# Altium footprint library Relays.PcbLib: 115 footprints (part 4 of 8)
Each footprint in its own frame and in the unit in brackets; x right, y up, seen from the top. Pads: shape width x height; smd on the part's side, far side on the other; paste and mask are expansions set on the pad; w line width, h text height; cw(c..) or ccw(c..) is an arc to the next point about the centre after c.
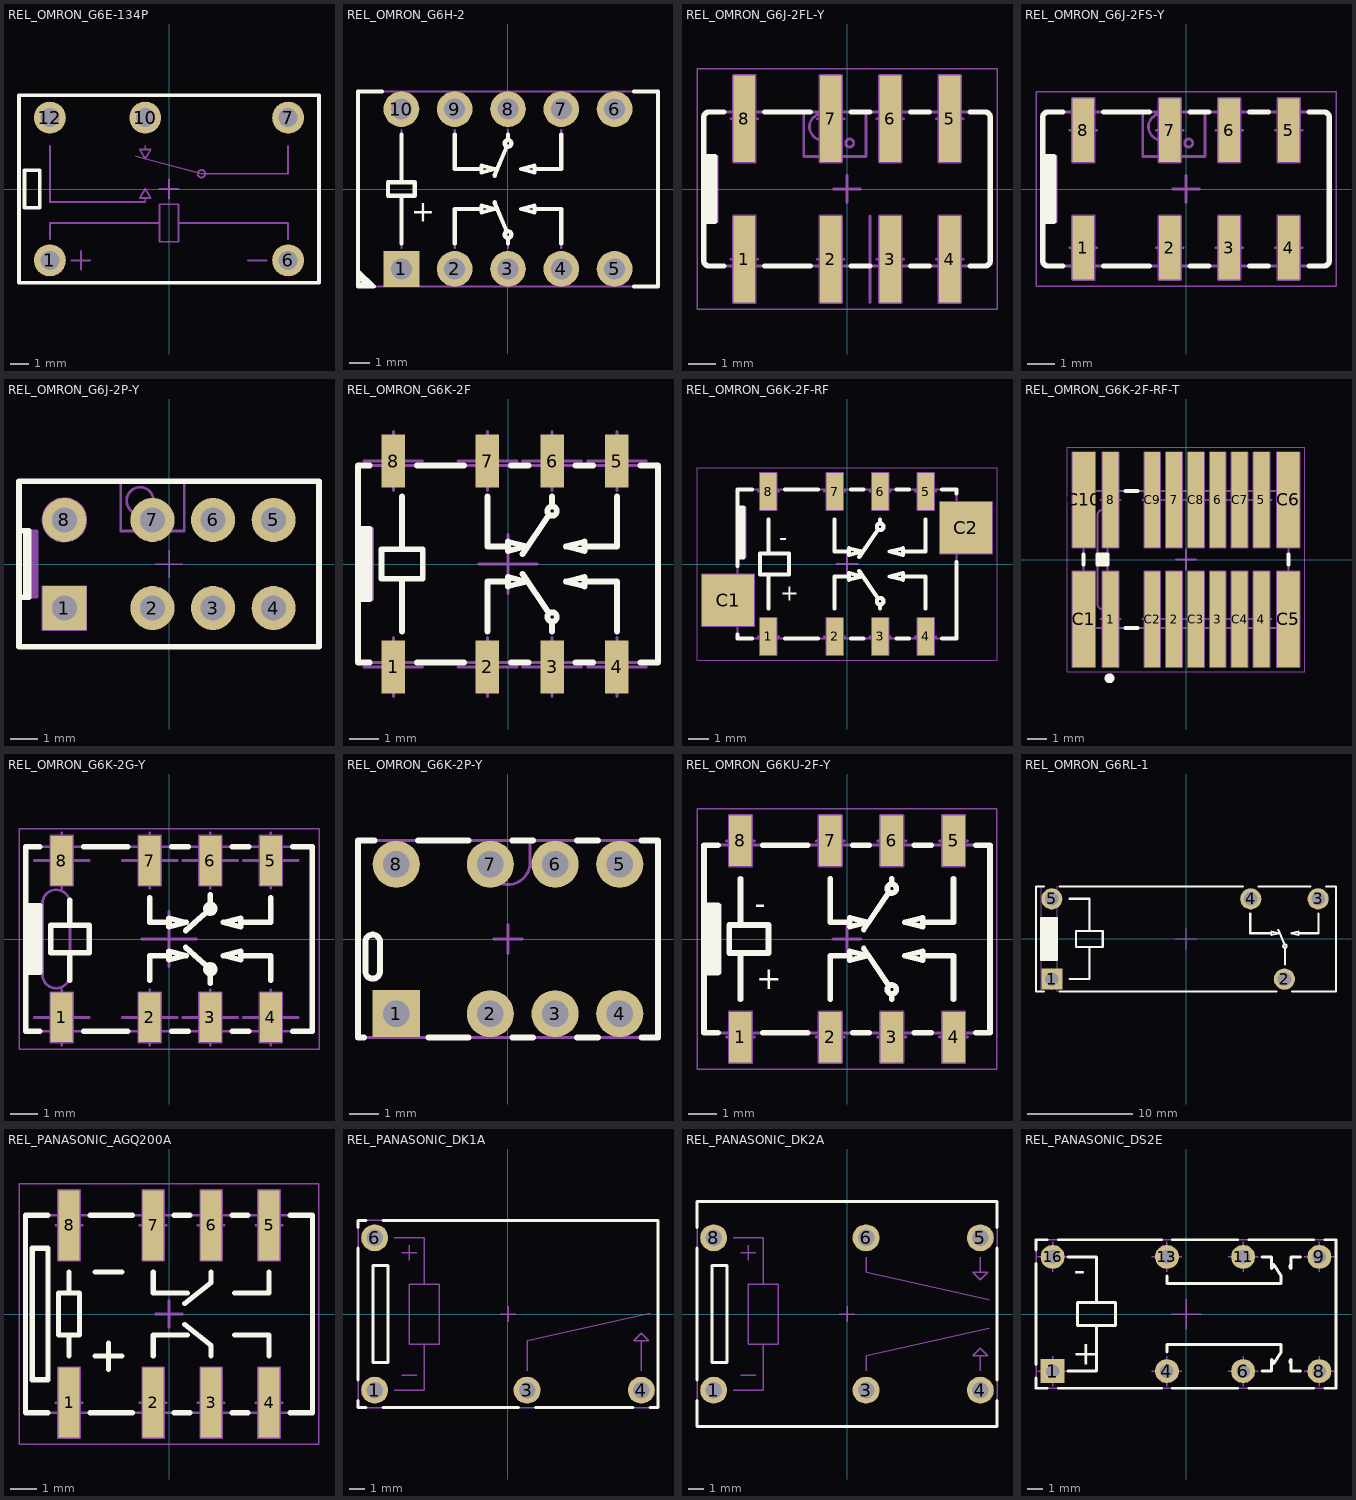
[diagram p3: the footprints below, top view; thin cyan lines are the x and y axes]

## REL_OMRON_G6E-134P [mm] "5 Leads, Row Spacing 7.62mm; Body 16mm x 10mm, OMRON G6E Series"
height 8
pads (5):
  round 1.7 hole 1: 1(-6.35,-3.81) 6(6.35,-3.81) 7(6.35,3.81) 10(-1.27,3.81) 12(-6.35,3.81)
Top Overlay:
  lines w0.2: -8,-5 8,-5 8,5 -8,5 -8,-5 ; -7.7,-1 -6.9,-1 -6.9,1 -7.7,1 -7.7,-1
Mechanical 8:
  lines w0.1: -6.85,-3.81 -6.35,-3.81 ; -6.85,3.81 -6.35,3.81 ; -6.35,-4.31 -6.35,-3.81 ; -6.35,-3.31 -6.35,-3.81 ; -6.35,3.31 -6.35,3.81 ; -6.35,4.31 -6.35,3.81 ; -5.85,-3.81 -6.35,-3.81 ; -5.85,3.81 -6.35,3.81 ; -1.77,3.81 -1.27,3.81 ; -1.27,3.31 -1.27,3.81 ; -1.27,4.31 -1.27,3.81 ; -0.77,3.81 -1.27,3.81 ; -0.5,0 0,0 ; 0,-0.5 0,0 ; 0,0.5 0,0 ; 0.5,0 0,0 ; 5.85,-3.81 6.35,-3.81 ; 5.85,3.81 6.35,3.81 ; 6.35,-4.31 6.35,-3.81 ; 6.35,-3.31 6.35,-3.81 ; 6.35,3.31 6.35,3.81 ; 6.35,4.31 6.35,3.81 ; 6.85,-3.81 6.35,-3.81 ; 6.85,3.81 6.35,3.81
Mechanical 14:
  circle w0.1: c1.73,0.81 r0.2
  lines w0.1: -6.35,-2.66 -6.35,-1.81 -0.5,-1.81 ; -6.35,2.31 -6.35,-0.69 -1.27,-0.69 -1.27,-0.49 ; -5.2,-3.81 -4.7,-3.81 ; -4.7,-4.31 -4.7,-3.81 ; -4.7,-3.31 -4.7,-3.81 ; -4.2,-3.81 -4.7,-3.81 ; -1.772,1.744 1.73,0.81 6.35,0.81 6.35,2.31 ; -1.27,2.11 -1.27,2.31 ; 0.5,-1.81 6.35,-1.81 6.35,-2.66 ; 4.2,-3.81 5.2,-3.81 ; -8,-5 -8,5 8,5 8,-5 -8,-5 ; -7.7,-1 -6.9,-1 -6.9,1 -7.7,1 -7.7,-1 ; -1.559,-0.49 -0.981,-0.49 -1.27,0.01 -1.559,-0.49 ; -1.559,2.11 -0.981,2.11 -1.27,1.61 -1.559,2.11 ; -0.5,-2.81 0.5,-2.81 0.5,-0.81 -0.5,-0.81 -0.5,-2.81
3D body "REL_OMRON_G6E-134P.stp": height 8, standoff -3.5, extent -8,-5 8,5

## REL_OMRON_G6H-2 [mm] "10 Leads, Row Spacing 7.62 mm; Body 14.3mm x 9.3mm, OMRON_G6H-2 Series"
height 5.4
pads (10):
  rect 1.7x1.7 hole 1: 1(-5.08,-3.81)
  round 1.7 hole 1: 2(-2.54,-3.81) 3(0,-3.81) 4(2.54,-3.81) 5(5.08,-3.81) 6(5.08,3.81) 7(2.54,3.81) 8(0,3.81) 9(-2.54,3.81) 10(-5.08,3.81)
Top Overlay:
  circle w0.2: c0,-2.175 r0.159
  circle w0.2: c0,2.175 r0.159
  lines w0.2: -7.15,-4.425 -6.925,-4.65 ; -7.15,-4.15 -6.65,-4.65 ; -7.15,-3.9 -6.4,-4.65 -7.15,-4.65 -7.15,4.65 -6,4.65 ; -5.08,-2.6 -5.08,-0.318 ; -5.08,0.318 -5.08,2.6 ; -2.54,-2.6 -2.54,-0.953 -1.27,-0.953 ; -2.54,2.6 -2.54,0.953 -1.27,0.953 ; -0.635,-0.635 -0.061,-2.028 ; -0.635,0.635 -0.061,2.028 ; 0,-2.6 0,-2.334 ; 0,2.334 0,2.6 ; 1.27,-0.953 2.54,-0.953 2.54,-2.6 ; 1.27,0.953 2.54,0.953 2.54,2.6 ; 6,-4.65 7.15,-4.65 7.15,4.65 6,4.65 ; -5.715,-0.318 -4.445,-0.318 -4.445,0.318 -5.715,0.318 -5.715,-0.318 ; -1.27,-1.111 -0.635,-0.953 -1.27,-0.794 -1.27,-1.111 ; -1.27,0.794 -0.635,0.953 -1.27,1.111 -1.27,0.794 ; 0.635,-0.953 1.27,-1.111 1.27,-0.794 0.635,-0.953 ; 0.635,0.953 1.27,1.111 1.27,0.794 0.635,0.953
  text "+" at -4.614,-1.558 h1
Mechanical 14:
  circle w0.1: c0,-2.175 r0.159
  circle w0.1: c0,2.175 r0.159
  lines w0.1: -7.15,-4.425 -6.925,-4.65 ; -7.15,-4.15 -6.65,-4.65 ; -7.15,-3.9 -6.4,-4.65 ; -5.08,-2.81 -5.08,-0.318 ; -5.08,0.318 -5.08,2.81 ; -2.54,-2.81 -2.54,-0.953 -1.27,-0.953 ; -2.54,2.81 -2.54,0.953 -1.27,0.953 ; -0.635,-0.635 -0.061,-2.028 ; -0.635,0.635 -0.061,2.028 ; 0,-2.81 0,-2.334 ; 0,2.334 0,2.81 ; 1.27,-0.953 2.54,-0.953 2.54,-2.81 ; 1.27,0.953 2.54,0.953 2.54,2.81 ; -7.15,-4.65 -7.15,4.65 7.15,4.65 7.15,-4.65 -7.15,-4.65 ; -5.715,-0.318 -4.445,-0.318 -4.445,0.318 -5.715,0.318 -5.715,-0.318 ; -1.27,-1.111 -0.635,-0.953 -1.27,-0.794 -1.27,-1.111 ; -1.27,0.794 -0.635,0.953 -1.27,1.111 -1.27,0.794 ; 0.635,-0.953 1.27,-1.111 1.27,-0.794 0.635,-0.953 ; 0.635,0.953 1.27,1.111 1.27,0.794 0.635,0.953
  text "+" at -4.614,-1.558 h1
3D body "REL_OMRON_G6H-2.stp": height 5.4, standoff -3.5, extent -7.15,-4.65 7.15,4.65

## REL_OMRON_G6J-2FL-Y [mm] "SMD Relay,  Body 10.6mm x 5.7mm, OMRON G6J-2FL-Y (Long Terminals)"
height 10
pads (8):
  rect 0.8x3.2 smd: 1(-3.8,-2.6) 2(-0.6,-2.6) 3(1.6,-2.6) 4(3.8,-2.6) 5(3.8,2.6) 6(1.6,2.6) 7(-0.6,2.6) 8(-3.8,2.6)
Top Overlay:
  lines w0.2: -5.3,-1.2 -4.9,-1.2 -4.9,1.2 -5.3,1.2 ; -5.2,-1.2 -5.2,1.2 ; -5.1,-1.2 -5.1,1.2 ; -5,-1.2 -5,1.2 ; -4.55,-2.85 -5.1,-2.85 cw(c-5.1,-2.65) -5.3,-2.65 -5.3,2.65 cw(c-5.1,2.65) -5.1,2.85 -4.55,2.85 ; -3.05,-2.85 -1.35,-2.85 ; -3.05,2.85 -1.35,2.85 ; 0.15,-2.85 0.85,-2.85 ; 0.15,2.85 0.85,2.85 ; 2.35,-2.85 3.05,-2.85 ; 2.35,2.85 3.05,2.85 ; 4.55,-2.85 5.1,-2.85 ccw(c5.1,-2.65) 5.3,-2.65 5.3,2.65 ccw(c5.1,2.65) 5.1,2.85 4.55,2.85
Mechanical 8:
  lines w0.1: -4.3,-2.6 -3.8,-2.6 ; -4.3,2.6 -3.8,2.6 ; -3.8,-3.1 -3.8,-2.6 ; -3.8,-2.1 -3.8,-2.6 ; -3.8,2.1 -3.8,2.6 ; -3.8,3.1 -3.8,2.6 ; -3.3,-2.6 -3.8,-2.6 ; -3.3,2.6 -3.8,2.6 ; -1.1,-2.6 -0.6,-2.6 ; -1.1,2.6 -0.6,2.6 ; -0.6,-3.1 -0.6,-2.6 ; -0.6,-2.1 -0.6,-2.6 ; -0.6,2.1 -0.6,2.6 ; -0.6,3.1 -0.6,2.6 ; -0.5,0 0,0 ; -0.1,-2.6 -0.6,-2.6 ; -0.1,2.6 -0.6,2.6 ; 0,-0.5 0,0 ; 0,0.5 0,0 ; 0.5,0 0,0 ; 0.85,-4.2 0.85,-1 ; 1.1,-2.6 1.6,-2.6 ; 1.1,2.6 1.6,2.6 ; 1.6,-3.1 1.6,-2.6 ; 1.6,-2.1 1.6,-2.6 ; 1.6,2.1 1.6,2.6 ; 1.6,3.1 1.6,2.6 ; 2.1,-2.6 1.6,-2.6 ; 2.1,2.6 1.6,2.6 ; 3.3,-2.6 3.8,-2.6 ; 3.3,2.6 3.8,2.6 ; 3.8,-3.1 3.8,-2.6 ; 3.8,-2.1 3.8,-2.6 ; 3.8,2.1 3.8,2.6 ; 3.8,3.1 3.8,2.6 ; 4.3,-2.6 3.8,-2.6 ; 4.3,2.6 3.8,2.6 ; -4.2,-4.2 -3.4,-4.2 -3.4,-1 -4.2,-1 -4.2,-4.2 ; -4.2,1 -3.4,1 -3.4,4.2 -4.2,4.2 -4.2,1 ; -1,-4.2 -0.2,-4.2 -0.2,-1 -1,-1 -1,-4.2 ; -1,1 -0.2,1 -0.2,4.2 -1,4.2 -1,1 ; 1.2,-4.2 2,-4.2 2,-1 1.2,-1 1.2,-4.2 ; 1.2,1 2,1 2,4.2 1.2,4.2 1.2,1 ; 3.4,-4.2 4.2,-4.2 4.2,-1 3.4,-1 3.4,-4.2 ; 3.4,1 4.2,1 4.2,4.2 3.4,4.2 3.4,1
Mechanical 14:
  circle w0.1: c-0.9,2.3 r0.49
  circle w0.1: c0.1,1.7 r0.15
  circle w0.1: c-0.9,2.3 r0.49
  lines w0.1: -5.3,-1.2 -4.8,-1.2 -4.8,1.2 -5.3,1.2 ; -5.2,-1.2 -5.2,1.2 ; -5.1,-1.2 -5.1,1.2 ; -5,-1.2 -5,1.2 ; -4.9,-1.2 -4.9,1.2 ; -4,-2.85 -4,-3.713 -3.6,-3.713 -3.6,-2.85 ; -4,2.85 -4,3.713 -3.6,3.713 -3.6,2.85 ; -1.6,2.72 -1.6,1.2 ; -1.6,2.85 -1.6,1.2 ; -0.8,-2.85 -0.8,-3.713 -0.4,-3.713 -0.4,-2.85 ; -0.8,2.85 -0.8,3.713 -0.4,3.713 -0.4,2.85 ; 0.7,2.72 0.7,1.2 ; 0.7,2.85 0.7,1.2 ; 1.4,-2.85 1.4,-3.713 1.8,-3.713 1.8,-2.85 ; 1.4,2.85 1.4,3.713 1.8,3.713 1.8,2.85 ; 3.6,-2.85 3.6,-3.713 4,-3.713 4,-2.85 ; 3.6,2.85 3.6,3.713 4,3.713 4,2.85 ; -1.6,1.2 0.7,1.2 ; -1.6,1.2 0.7,1.2 ; -5.3,-2.65 ccw(c-5.1,-2.65) -5.1,-2.85 5.1,-2.85 ccw(c5.1,-2.65) 5.3,-2.65 5.3,2.65 ccw(c5.1,2.65) 5.1,2.85 -5.1,2.85 ccw(c-5.1,2.65) -5.3,2.65 -5.3,-2.65
Mechanical 15:
  lines w0.05: -5.55,-4.45 -5.55,4.45 5.55,4.45 5.55,-4.45 -5.55,-4.45
3D body "REL_OMRON_G6J-2FL-Y.stp": height 10, standoff 0, extent -5.3,-3.713 5.3,3.713

## REL_OMRON_G6J-2FS-Y [mm] "SMD Relay,  Body 10.6mm x 5.7mm, OMRON G6J-2FS-Y (Short Terminals)"
height 10
pads (8):
  rect 0.8x2.35 smd: 1(-3.8,-2.175) 2(-0.6,-2.175) 3(1.6,-2.175) 4(3.8,-2.175) 5(3.8,2.175) 6(1.6,2.175) 7(-0.6,2.175) 8(-3.8,2.175)
Top Overlay:
  lines w0.2: -5.3,-1.2 -4.9,-1.2 -4.9,1.2 -5.3,1.2 ; -5.2,-1.2 -5.2,1.2 ; -5.1,-1.2 -5.1,1.2 ; -5,-1.2 -5,1.2 ; -4.55,-2.85 -5.1,-2.85 cw(c-5.1,-2.65) -5.3,-2.65 -5.3,2.65 cw(c-5.1,2.65) -5.1,2.85 -4.55,2.85 ; -3.05,-2.85 -1.35,-2.85 ; -3.05,2.85 -1.35,2.85 ; 0.15,-2.85 0.85,-2.85 ; 0.15,2.85 0.85,2.85 ; 2.35,-2.85 3.05,-2.85 ; 2.35,2.85 3.05,2.85 ; 4.55,-2.85 5.1,-2.85 ccw(c5.1,-2.65) 5.3,-2.65 5.3,2.65 ccw(c5.1,2.65) 5.1,2.85 4.55,2.85
Mechanical 8:
  lines w0.1: -4.3,-2.175 -3.8,-2.175 ; -4.3,2.175 -3.8,2.175 ; -3.8,-2.675 -3.8,-2.175 ; -3.8,-1.675 -3.8,-2.175 ; -3.8,1.675 -3.8,2.175 ; -3.8,2.675 -3.8,2.175 ; -3.3,-2.175 -3.8,-2.175 ; -3.3,2.175 -3.8,2.175 ; -1.1,-2.175 -0.6,-2.175 ; -1.1,2.175 -0.6,2.175 ; -0.6,-2.675 -0.6,-2.175 ; -0.6,-1.675 -0.6,-2.175 ; -0.6,1.675 -0.6,2.175 ; -0.6,2.675 -0.6,2.175 ; -0.5,0 0,0 ; -0.1,-2.175 -0.6,-2.175 ; -0.1,2.175 -0.6,2.175 ; 0,-0.5 0,0 ; 0,0.5 0,0 ; 0.5,0 0,0 ; 1.1,-2.175 1.6,-2.175 ; 1.1,2.175 1.6,2.175 ; 1.6,-2.675 1.6,-2.175 ; 1.6,-1.675 1.6,-2.175 ; 1.6,1.675 1.6,2.175 ; 1.6,2.675 1.6,2.175 ; 2.1,-2.175 1.6,-2.175 ; 2.1,2.175 1.6,2.175 ; 3.3,-2.175 3.8,-2.175 ; 3.3,2.175 3.8,2.175 ; 3.8,-2.675 3.8,-2.175 ; 3.8,-1.675 3.8,-2.175 ; 3.8,1.675 3.8,2.175 ; 3.8,2.675 3.8,2.175 ; 4.3,-2.175 3.8,-2.175 ; 4.3,2.175 3.8,2.175 ; -4.2,-3.35 -4.2,-1 -3.4,-1 -3.4,-3.35 -4.2,-3.35 ; -4.2,1 -4.2,3.35 -3.4,3.35 -3.4,1 -4.2,1 ; -1,-3.35 -1,-1 -0.2,-1 -0.2,-3.35 -1,-3.35 ; -1,1 -1,3.35 -0.2,3.35 -0.2,1 -1,1 ; 1.2,-3.35 1.2,-1 2,-1 2,-3.35 1.2,-3.35 ; 1.2,1 1.2,3.35 2,3.35 2,1 1.2,1 ; 3.4,-3.35 3.4,-1 4.2,-1 4.2,-3.35 3.4,-3.35 ; 3.4,1 3.4,3.35 4.2,3.35 4.2,1 3.4,1
Mechanical 14:
  circle w0.1: c-0.9,2.3 r0.49
  circle w0.1: c0.1,1.7 r0.15
  circle w0.1: c-0.9,2.3 r0.49
  lines w0.1: -5.3,-1.2 -4.8,-1.2 -4.8,1.2 -5.3,1.2 ; -5.2,-1.2 -5.2,1.2 ; -5.1,-1.2 -5.1,1.2 ; -5,-1.2 -5,1.2 ; -4.9,-1.2 -4.9,1.2 ; -1.6,2.72 -1.6,1.2 ; -1.6,2.85 -1.6,1.2 ; 0.7,2.72 0.7,1.2 ; 0.7,2.85 0.7,1.2 ; -1.6,1.2 0.7,1.2 ; -1.6,1.2 0.7,1.2 ; -5.3,-2.65 ccw(c-5.1,-2.65) -5.1,-2.85 5.1,-2.85 ccw(c5.1,-2.65) 5.3,-2.65 5.3,2.65 ccw(c5.1,2.65) 5.1,2.85 -5.1,2.85 ccw(c-5.1,2.65) -5.3,2.65 -5.3,-2.65
Mechanical 15:
  lines w0.05: -5.55,-3.6 -5.55,3.6 5.55,3.6 5.55,-3.6 -5.55,-3.6
3D body "REL_OMRON_G6J-2FS-Y.stp": height 10, standoff 0, extent -5.3,-2.863 5.3,2.863

## REL_OMRON_G6J-2P-Y [mm] "THT Relay, Body 10.9mm x 6mm, OMRON_G6J-2P"
height 9.3
pads (8):
  rect 1.6x1.6 hole 0.9: 1(-3.8,-1.6)
  round 1.6 hole 0.9: 2(-0.6,-1.6) 3(1.6,-1.6) 4(3.8,-1.6) 5(3.8,1.6) 6(1.6,1.6) 7(-0.6,1.6) 8(-3.8,1.6)
Top Overlay:
  lines w0.2: -5.3,-1.2 -5.1,-1.2 -5.1,1.2 -5.3,1.2 ; -5.2,-1.2 -5.2,1.2 ; -5.45,-3 5.45,-3 5.45,3 -5.45,3 -5.45,-3
Mechanical 8:
  circle w0.05: c-3.8,1.6 r0.45
  circle w0.05: c-3.8,1.6 r0.8
  circle w0.05: c-3.8,-1.6 r0.45
  lines w0.05: -4.3,-1.6 -3.8,-1.6 ; -4.3,1.6 -3.8,1.6 ; -3.8,-2.1 -3.8,-1.6 ; -3.8,-1.1 -3.8,-1.6 ; -3.8,1.1 -3.8,1.6 ; -3.8,2.1 -3.8,1.6 ; -3.3,-1.6 -3.8,-1.6 ; -3.3,1.6 -3.8,1.6 ; -1.1,-1.6 -0.6,-1.6 ; -1.1,1.6 -0.6,1.6 ; -0.6,-2.1 -0.6,-1.6 ; -0.6,-1.1 -0.6,-1.6 ; -0.6,1.1 -0.6,1.6 ; -0.6,2.1 -0.6,1.6 ; -0.5,0 0,0 ; -0.1,-1.6 -0.6,-1.6 ; -0.1,1.6 -0.6,1.6 ; 0,-0.5 0,0 ; 0,0.5 0,0 ; 0.5,0 0,0 ; 1.1,-1.6 1.6,-1.6 ; 1.1,1.6 1.6,1.6 ; 1.6,-2.1 1.6,-1.6 ; 1.6,-1.1 1.6,-1.6 ; 1.6,1.1 1.6,1.6 ; 1.6,2.1 1.6,1.6 ; 2.1,-1.6 1.6,-1.6 ; 2.1,1.6 1.6,1.6 ; 3.3,-1.6 3.8,-1.6 ; 3.3,1.6 3.8,1.6 ; 3.8,-2.1 3.8,-1.6 ; 3.8,-1.1 3.8,-1.6 ; 3.8,1.1 3.8,1.6 ; 3.8,2.1 3.8,1.6 ; 4.3,-1.6 3.8,-1.6 ; 4.3,1.6 3.8,1.6 ; -4.6,-2.4 -4.6,-0.8 -3,-0.8 -3,-2.4 -4.6,-2.4
Mechanical 14:
  circle w0.1: c-1.05,2.3 r0.49
  circle w0.1: c-0.05,1.7 r0.15
  lines w0.1: -5.3,-1.2 -4.8,-1.2 -4.8,1.2 -5.3,1.2 ; -5.2,-1.2 -5.2,1.2 ; -5.1,-1.2 -5.1,1.2 ; -5,-1.2 -5,1.2 ; -4.9,-1.2 -4.9,1.2 ; -1.75,3 -1.75,1.2 0.55,1.2 0.55,3 ; -5.45,-3 5.45,-3 5.45,3 -5.45,3 -5.45,-3
3D body "REL_OMRON_G6J-2P-Y.stp": height 9.3, standoff -3.5, extent -5.45,-3 5.45,3

## REL_OMRON_G6K-2F [mm] "SMD Relay,  Body 10.2mm x 6.7mm, OMRON_G6K-2F"
height 5.4
pads (8):
  rect 0.8x1.8 smd: 1(-3.9,-3.5) 2(-0.7,-3.5) 3(1.5,-3.5) 4(3.7,-3.5) 5(3.7,3.5) 6(1.5,3.5) 7(-0.7,3.5) 8(-3.9,3.5)
Top Overlay:
  circle w0.2: c1.5,1.8 r0.159
  circle w0.2: c1.5,-1.8 r0.159
  lines w0.2: -5.1,-1.2 -4.7,-1.2 -4.7,1.2 -5.1,1.2 ; -5,-1.2 -5,1.2 ; -4.9,-1.2 -4.9,1.2 ; -4.8,-1.2 -4.8,1.2 ; -4.7,-3.35 -5.1,-3.35 -5.1,3.35 -4.7,3.35 ; -3.6,-2.3 -3.6,-0.5 ; -3.6,0.5 -3.6,2.3 ; -3.1,-3.35 -1.5,-3.35 ; -3.1,3.35 -1.5,3.35 ; -0.7,-2.3 -0.7,-0.6 0,-0.6 ; -0.7,2.3 -0.7,0.6 0,0.6 ; 0.1,-3.35 0.7,-3.35 ; 0.1,3.35 0.7,3.35 ; 0.493,-0.338 1.4,-1.675 ; 0.493,0.338 1.4,1.675 ; 1.5,-2.3 1.5,-2 ; 1.5,2 1.5,2.3 ; 2.3,-3.35 2.9,-3.35 ; 2.3,3.35 2.9,3.35 ; 2.6,-0.6 3.7,-0.6 3.7,-2.3 ; 2.6,0.6 3.7,0.6 3.7,2.3 ; 4.5,-3.35 5.1,-3.35 5.1,3.35 4.5,3.35 ; -4.3,-0.5 -4.3,0.5 -2.9,0.5 -2.9,-0.5 -4.3,-0.5 ; 0,-0.759 0.635,-0.6 0,-0.441 0,-0.759 ; 0,0.441 0,0.759 0.635,0.6 0,0.441 ; 1.965,-0.6 2.6,-0.759 2.6,-0.441 1.965,-0.6 ; 1.965,0.6 2.6,0.441 2.6,0.759 1.965,0.6
Mechanical 8:
  lines w0.1: -4.9,-3.5 -3.9,-3.5 ; -4.9,3.5 -3.9,3.5 ; -3.9,-4.5 -3.9,-3.5 ; -3.9,-2.5 -3.9,-3.5 ; -3.9,2.5 -3.9,3.5 ; -3.9,4.5 -3.9,3.5 ; -2.9,-3.5 -3.9,-3.5 ; -2.9,3.5 -3.9,3.5 ; -1.7,-3.5 -0.7,-3.5 ; -1.7,3.5 -0.7,3.5 ; -1,0 0,0 ; -0.7,-4.5 -0.7,-3.5 ; -0.7,-2.5 -0.7,-3.5 ; -0.7,2.5 -0.7,3.5 ; -0.7,4.5 -0.7,3.5 ; 0,-1 0,0 ; 0,1 0,0 ; 0.3,-3.5 -0.7,-3.5 ; 0.3,3.5 -0.7,3.5 ; 0.5,-3.5 1.5,-3.5 ; 0.5,3.5 1.5,3.5 ; 1,0 0,0 ; 1.5,-4.5 1.5,-3.5 ; 1.5,-2.5 1.5,-3.5 ; 1.5,2.5 1.5,3.5 ; 1.5,4.5 1.5,3.5 ; 2.5,-3.5 1.5,-3.5 ; 2.5,3.5 1.5,3.5 ; 2.7,-3.5 3.7,-3.5 ; 2.7,3.5 3.7,3.5 ; 3.7,-4.5 3.7,-3.5 ; 3.7,-2.5 3.7,-3.5 ; 3.7,2.5 3.7,3.5 ; 3.7,4.5 3.7,3.5 ; 4.7,-3.5 3.7,-3.5 ; 4.7,3.5 3.7,3.5
Mechanical 14:
  circle w0.1: c1.5,1.8 r0.159
  circle w0.1: c1.5,-1.8 r0.159
  lines w0.1: -5.1,-1.2 -4.6,-1.2 -4.6,1.2 -5.1,1.2 ; -5,-1.2 -5,1.2 ; -4.9,-1.2 -4.9,1.2 ; -4.8,-1.2 -4.8,1.2 ; -4.7,-1.2 -4.7,1.2 ; -3.6,-2.3 -3.6,-0.5 ; -3.6,0.5 -3.6,2.3 ; -0.7,-2.3 -0.7,-0.6 0,-0.6 ; -0.7,2.3 -0.7,0.6 0,0.6 ; 0.493,-0.338 1.4,-1.675 ; 0.493,0.338 1.4,1.675 ; 1.5,-2.3 1.5,-2 ; 1.5,2 1.5,2.3 ; 2.6,-0.6 3.7,-0.6 3.7,-2.3 ; 2.6,0.6 3.7,0.6 3.7,2.3 ; -5.1,-3.35 -5.1,3.35 5.1,3.35 5.1,-3.35 -5.1,-3.35 ; -4.3,-0.5 -4.3,0.5 -2.9,0.5 -2.9,-0.5 -4.3,-0.5 ; 0,-0.759 0.635,-0.6 0,-0.441 0,-0.759 ; 0,0.441 0,0.759 0.635,0.6 0,0.441 ; 1.965,-0.6 2.6,-0.759 2.6,-0.441 1.965,-0.6 ; 1.965,0.6 2.6,0.441 2.6,0.759 1.965,0.6
3D body "REL_OMRON_G6K-2F.stp": height 5.4, standoff 0, extent -5.1,-3.9 5.1,3.9

## REL_OMRON_G6K-2F-RF [mm] "SMD Relay,  Body 10.3mm x 6.9mm, OMRON G6KU-2F-RF"
height 5.4
pads (10):
  rect 0.8x1.8 smd: 1(-3.8,-3.5) 2(-0.6,-3.5) 3(1.6,-3.5) 4(3.8,-3.5) 5(3.8,3.5) 6(1.6,3.5) 7(-0.6,3.5) 8(-3.8,3.5)
  rect 2.5x2.5 smd: C1(-5.75,-1.75) C2(5.75,1.75)
Top Overlay:
  circle w0.2: c1.6,1.8 r0.159
  circle w0.2: c1.6,-1.8 r0.159
  lines w0.2: -5.3,-3.4 -5.3,-3.6 -4.6,-3.6 ; -5.3,-0.1 -5.3,3.6 -4.6,3.6 ; -5.2,0.325 -5.2,2.725 ; -5.1,0.325 -5.1,2.725 ; -3.8,-2.15 -3.8,-0.6 ; -3.8,0.6 -3.8,2.15 ; -3,-3.6 -1.4,-3.6 ; -3,3.6 -1.4,3.6 ; -0.6,-2.15 -0.6,-0.6 0.1,-0.6 ; -0.6,2.15 -0.6,0.6 0.1,0.6 ; 0.2,-3.6 0.8,-3.6 ; 0.2,3.6 0.8,3.6 ; 0.593,-0.338 1.5,-1.675 ; 0.593,0.338 1.5,1.675 ; 1.6,-2.15 1.6,-2 ; 1.6,2 1.6,2.15 ; 2.4,-3.6 3,-3.6 ; 2.4,3.6 3,3.6 ; 2.7,-0.6 3.8,-0.6 3.8,-2.15 ; 2.7,0.6 3.8,0.6 3.8,2.15 ; 4.6,-3.6 5.3,-3.6 5.3,0.1 ; 4.6,3.6 5.3,3.6 5.3,3.4 ; -5.3,0.325 -5,0.325 -5,2.725 -5.3,2.725 -5.3,0.325 ; -4.2,-0.5 -4.2,0.5 -2.8,0.5 -2.8,-0.5 -4.2,-0.5 ; 0.1,-0.759 0.735,-0.6 0.1,-0.441 0.1,-0.759 ; 0.1,0.441 0.1,0.759 0.735,0.6 0.1,0.441 ; 2.065,-0.6 2.7,-0.759 2.7,-0.441 2.065,-0.6 ; 2.065,0.6 2.7,0.441 2.7,0.759 2.065,0.6
  text "-" at -3.284,0.89 h0.8
  text "+" at -3.234,-1.785 h0.8
Mechanical 8:
  lines w0.1: -6.25,-1.75 -5.75,-1.75 ; -5.75,-2.25 -5.75,-1.75 ; -5.75,-1.25 -5.75,-1.75 ; -5.25,-1.75 -5.75,-1.75 ; -4.3,-3.5 -3.8,-3.5 ; -4.3,3.5 -3.8,3.5 ; -3.8,-4 -3.8,-3.5 ; -3.8,-3 -3.8,-3.5 ; -3.8,3 -3.8,3.5 ; -3.8,4 -3.8,3.5 ; -3.3,-3.5 -3.8,-3.5 ; -3.3,3.5 -3.8,3.5 ; -1.1,-3.5 -0.6,-3.5 ; -1.1,3.5 -0.6,3.5 ; -0.6,-4 -0.6,-3.5 ; -0.6,-3 -0.6,-3.5 ; -0.6,3 -0.6,3.5 ; -0.6,4 -0.6,3.5 ; -0.1,-3.5 -0.6,-3.5 ; -0.1,3.5 -0.6,3.5 ; 1.1,-3.5 1.6,-3.5 ; 1.1,3.5 1.6,3.5 ; 1.6,-4 1.6,-3.5 ; 1.6,-3 1.6,-3.5 ; 1.6,3 1.6,3.5 ; 1.6,4 1.6,3.5 ; 2.1,-3.5 1.6,-3.5 ; 2.1,3.5 1.6,3.5 ; 3.3,-3.5 3.8,-3.5 ; 3.3,3.5 3.8,3.5 ; 3.8,-4 3.8,-3.5 ; 3.8,-3 3.8,-3.5 ; 3.8,3 3.8,3.5 ; 3.8,4 3.8,3.5 ; 4.3,-3.5 3.8,-3.5 ; 4.3,3.5 3.8,3.5 ; 5.25,1.75 5.75,1.75 ; 5.75,1.25 5.75,1.75 ; 5.75,2.25 5.75,1.75 ; 6.25,1.75 5.75,1.75 ; 0,0 0,-0.5 0,0 ; 0,0 0.5,0 0,0 ; 0,0 0,0.5 0,0 ; 0,0 -0.5,0 0,0 ; -7,-3 -4.5,-3 -4.5,-0.5 -7,-0.5 -7,-3 ; -4.2,-4.4 -3.4,-4.4 -3.4,-2.6 -4.2,-2.6 -4.2,-4.4 ; -4.2,2.6 -3.4,2.6 -3.4,4.4 -4.2,4.4 -4.2,2.6 ; -1,-4.4 -0.2,-4.4 -0.2,-2.6 -1,-2.6 -1,-4.4 ; -1,2.6 -0.2,2.6 -0.2,4.4 -1,4.4 -1,2.6 ; 1.2,-4.4 2,-4.4 2,-2.6 1.2,-2.6 1.2,-4.4 ; 1.2,2.6 2,2.6 2,4.4 1.2,4.4 1.2,2.6 ; 3.4,-4.4 4.2,-4.4 4.2,-2.6 3.4,-2.6 3.4,-4.4 ; 3.4,2.6 4.2,2.6 4.2,4.4 3.4,4.4 3.4,2.6 ; 4.5,0.5 7,0.5 7,3 4.5,3 4.5,0.5
Mechanical 14:
  circle w0.1: c1.6,1.8 r0.159
  circle w0.1: c1.6,-1.8 r0.159
  lines w0.1: -5.305,-0.5 -6.55,-0.5 -6.55,-3 -5.3,-3 ; -5.2,0.325 -5.2,2.725 ; -5.1,0.325 -5.1,2.725 ; -5,0.325 -5,2.725 ; -4.2,-3.6 -4.2,-4.05 -3.4,-4.05 -3.4,-3.6 ; -4.2,3.6 -4.2,4.05 -3.4,4.05 -3.4,3.6 ; -3.8,-2.15 -3.8,-0.6 ; -3.8,0.6 -3.8,2.15 ; -1,-3.6 -1,-4.05 -0.2,-4.05 -0.2,-3.6 ; -1,3.6 -1,4.05 -0.2,4.05 -0.2,3.6 ; -0.6,-2.15 -0.6,-0.6 0.1,-0.6 ; -0.6,2.15 -0.6,0.6 0.1,0.6 ; 0.593,-0.338 1.5,-1.675 ; 0.593,0.338 1.5,1.675 ; 1.2,-3.6 1.2,-4.05 2,-4.05 2,-3.6 ; 1.2,3.6 1.2,4.05 2,4.05 2,3.6 ; 1.6,-2.15 1.6,-2 ; 1.6,2 1.6,2.15 ; 2.7,-0.6 3.8,-0.6 3.8,-2.15 ; 2.7,0.6 3.8,0.6 3.8,2.15 ; 3.4,-3.6 3.4,-4.05 4.2,-4.05 4.2,-3.6 ; 3.4,3.6 3.4,4.05 4.2,4.05 4.2,3.6 ; 5.3,3 6.55,3 6.55,0.5 5.305,0.5 ; -5.3,-3.6 -5.3,3.6 5.3,3.6 5.3,-3.6 -5.3,-3.6 ; -5.3,0.325 -5.3,2.725 -4.9,2.725 -4.9,0.325 -5.3,0.325 ; -4.2,-0.5 -4.2,0.5 -2.8,0.5 -2.8,-0.5 -4.2,-0.5 ; 0.1,-0.759 0.735,-0.6 0.1,-0.441 0.1,-0.759 ; 0.1,0.441 0.1,0.759 0.735,0.6 0.1,0.441 ; 2.065,-0.6 2.7,-0.759 2.7,-0.441 2.065,-0.6 ; 2.065,0.6 2.7,0.441 2.7,0.759 2.065,0.6
  text "-" at -3.284,0.89 h0.8
  text "+" at -3.234,-1.785 h0.8
Mechanical 15:
  lines w0.05: -7.25,-4.65 7.25,-4.65 7.25,4.65 -7.25,4.65 -7.25,-4.65
3D body "REL_OMRON_G6K-2F-RF.stp": height 5.7, standoff 0, extent -6.55,-4.05 6.55,4.05

## REL_OMRON_G6K-2F-RF-T [mm] "SMD Relay,  Body 10.7mm x 6.9mm, OMRON G6KU-2F-RF-T"
height 5.4
pads (18):
  rect 0.8x4.8 smd: 1(-3.8,-3) 2(-0.6,-3) 3(1.6,-3) 4(3.8,-3) 5(3.8,3) 6(1.6,3) 7(-0.6,3) 8(-3.8,3) C2(-1.7,-3) C3(0.5,-3) C4(2.7,-3) C7(2.7,3) C8(0.5,3) C9(-1.7,3)
  rect 1.15x4.8 smd: C1(-5.15,-3) C5(5.15,-3) C6(5.15,3) C10(-5.15,3)
Top Overlay:
  circle w0.25: c-3.85,-5.975 r0.125
  lines w0.2: -5.15,-0.25 -5.15,0.25 ; -4.35,-0.25 -4.35,0.25 ; -4.25,-0.25 -4.25,0.25 ; -4.15,-0.25 -4.15,0.25 ; -4.05,-0.25 -4.05,0.25 ; -3.05,-3.45 -2.45,-3.45 ; -3.05,3.45 -2.45,3.45 ; 5.15,-0.25 5.15,0.25 ; -4.45,-0.25 -4.45,0.25 -3.95,0.25 -3.95,-0.25 -4.45,-0.25
Mechanical 8:
  lines w0.1: -5.65,-3 -5.15,-3 ; -5.65,3 -5.15,3 ; -5.15,-3.5 -5.15,-3 ; -5.15,-2.5 -5.15,-3 ; -5.15,2.5 -5.15,3 ; -5.15,3.5 -5.15,3 ; -4.65,-3 -5.15,-3 ; -4.65,3 -5.15,3 ; -4.3,-3 -3.8,-3 ; -4.3,3 -3.8,3 ; -3.8,-3.5 -3.8,-3 ; -3.8,-2.5 -3.8,-3 ; -3.8,2.5 -3.8,3 ; -3.8,3.5 -3.8,3 ; -3.3,-3 -3.8,-3 ; -3.3,3 -3.8,3 ; -2.2,-3 -1.7,-3 ; -2.2,3 -1.7,3 ; -1.7,-3.5 -1.7,-3 ; -1.7,-2.5 -1.7,-3 ; -1.7,2.5 -1.7,3 ; -1.7,3.5 -1.7,3 ; -1.2,-3 -1.7,-3 ; -1.2,3 -1.7,3 ; -1.1,-3 -0.6,-3 ; -1.1,3 -0.6,3 ; -0.6,-3.5 -0.6,-3 ; -0.6,-2.5 -0.6,-3 ; -0.6,2.5 -0.6,3 ; -0.6,3.5 -0.6,3 ; -0.5,0 0,0 ; -0.1,-3 -0.6,-3 ; -0.1,3 -0.6,3 ; 0,-3 0.5,-3 ; 0,-0.5 0,0 ; 0,0.5 0,0 ; 0,3 0.5,3 ; 0.5,-3.5 0.5,-3 ; 0.5,-2.5 0.5,-3 ; 0.5,0 0,0 ; 0.5,2.5 0.5,3 ; 0.5,3.5 0.5,3 ; 1,-3 0.5,-3 ; 1,3 0.5,3 ; 1.1,-3 1.6,-3 ; 1.1,3 1.6,3 ; 1.6,-3.5 1.6,-3 ; 1.6,-2.5 1.6,-3 ; 1.6,2.5 1.6,3 ; 1.6,3.5 1.6,3 ; 2.1,-3 1.6,-3 ; 2.1,3 1.6,3 ; 2.2,-3 2.7,-3 ; 2.2,3 2.7,3 ; 2.7,-3.5 2.7,-3 ; 2.7,-2.5 2.7,-3 ; 2.7,2.5 2.7,3 ; 2.7,3.5 2.7,3 ; 3.2,-3 2.7,-3 ; 3.2,3 2.7,3 ; 3.3,-3 3.8,-3 ; 3.3,3 3.8,3 ; 3.8,-3.5 3.8,-3 ; 3.8,-2.5 3.8,-3 ; 3.8,2.5 3.8,3 ; 3.8,3.5 3.8,3 ; 4.3,-3 3.8,-3 ; 4.3,3 3.8,3 ; 4.65,-3 5.15,-3 ; 4.65,3 5.15,3 ; 5.15,-3.5 5.15,-3 ; 5.15,-2.5 5.15,-3 ; 5.15,2.5 5.15,3 ; 5.15,3.5 5.15,3 ; 5.65,-3 5.15,-3 ; 5.65,3 5.15,3 ; -5.725,-5.4 -5.725,-0.6 -4.575,-0.6 -4.575,-5.4 -5.725,-5.4 ; -5.725,0.6 -5.725,5.4 -4.575,5.4 -4.575,0.6 -5.725,0.6 ; -4.2,-5.4 -4.2,-0.6 -3.4,-0.6 -3.4,-5.4 -4.2,-5.4 ; -4.2,0.6 -4.2,5.4 -3.4,5.4 -3.4,0.6 -4.2,0.6 ; -2.1,-5.4 -2.1,-0.6 -1.3,-0.6 -1.3,-5.4 -2.1,-5.4 ; -2.1,0.6 -2.1,5.4 -1.3,5.4 -1.3,0.6 -2.1,0.6 ; -1,-5.4 -1,-0.6 -0.2,-0.6 -0.2,-5.4 -1,-5.4 ; -1,0.6 -1,5.4 -0.2,5.4 -0.2,0.6 -1,0.6 ; 0.1,-5.4 0.1,-0.6 0.9,-0.6 0.9,-5.4 0.1,-5.4 ; 0.1,0.6 0.1,5.4 0.9,5.4 0.9,0.6 0.1,0.6 ; 1.2,-5.4 1.2,-0.6 2,-0.6 2,-5.4 1.2,-5.4 ; 1.2,0.6 1.2,5.4 2,5.4 2,0.6 1.2,0.6 ; 2.3,-5.4 2.3,-0.6 3.1,-0.6 3.1,-5.4 2.3,-5.4 ; 2.3,0.6 2.3,5.4 3.1,5.4 3.1,0.6 2.3,0.6 ; 3.4,-5.4 3.4,-0.6 4.2,-0.6 4.2,-5.4 3.4,-5.4 ; 3.4,0.6 3.4,5.4 4.2,5.4 4.2,0.6 3.4,0.6 ; 4.575,-5.4 4.575,-0.6 5.725,-0.6 5.725,-5.4 4.575,-5.4 ; 4.575,0.6 4.575,5.4 5.725,5.4 5.725,0.6 4.575,0.6